# Altium footprint library KwantLib.PcbLib: 249 footprints (part 6 of 16)
Each footprint in its own frame and in the unit in brackets; x right, y up, seen from the top. Pads: shape width x height; smd on the part's side, far side on the other; paste and mask are expansions set on the pad; w line width, h text height; cw(c..) or ccw(c..) is an arc to the next point about the centre after c.
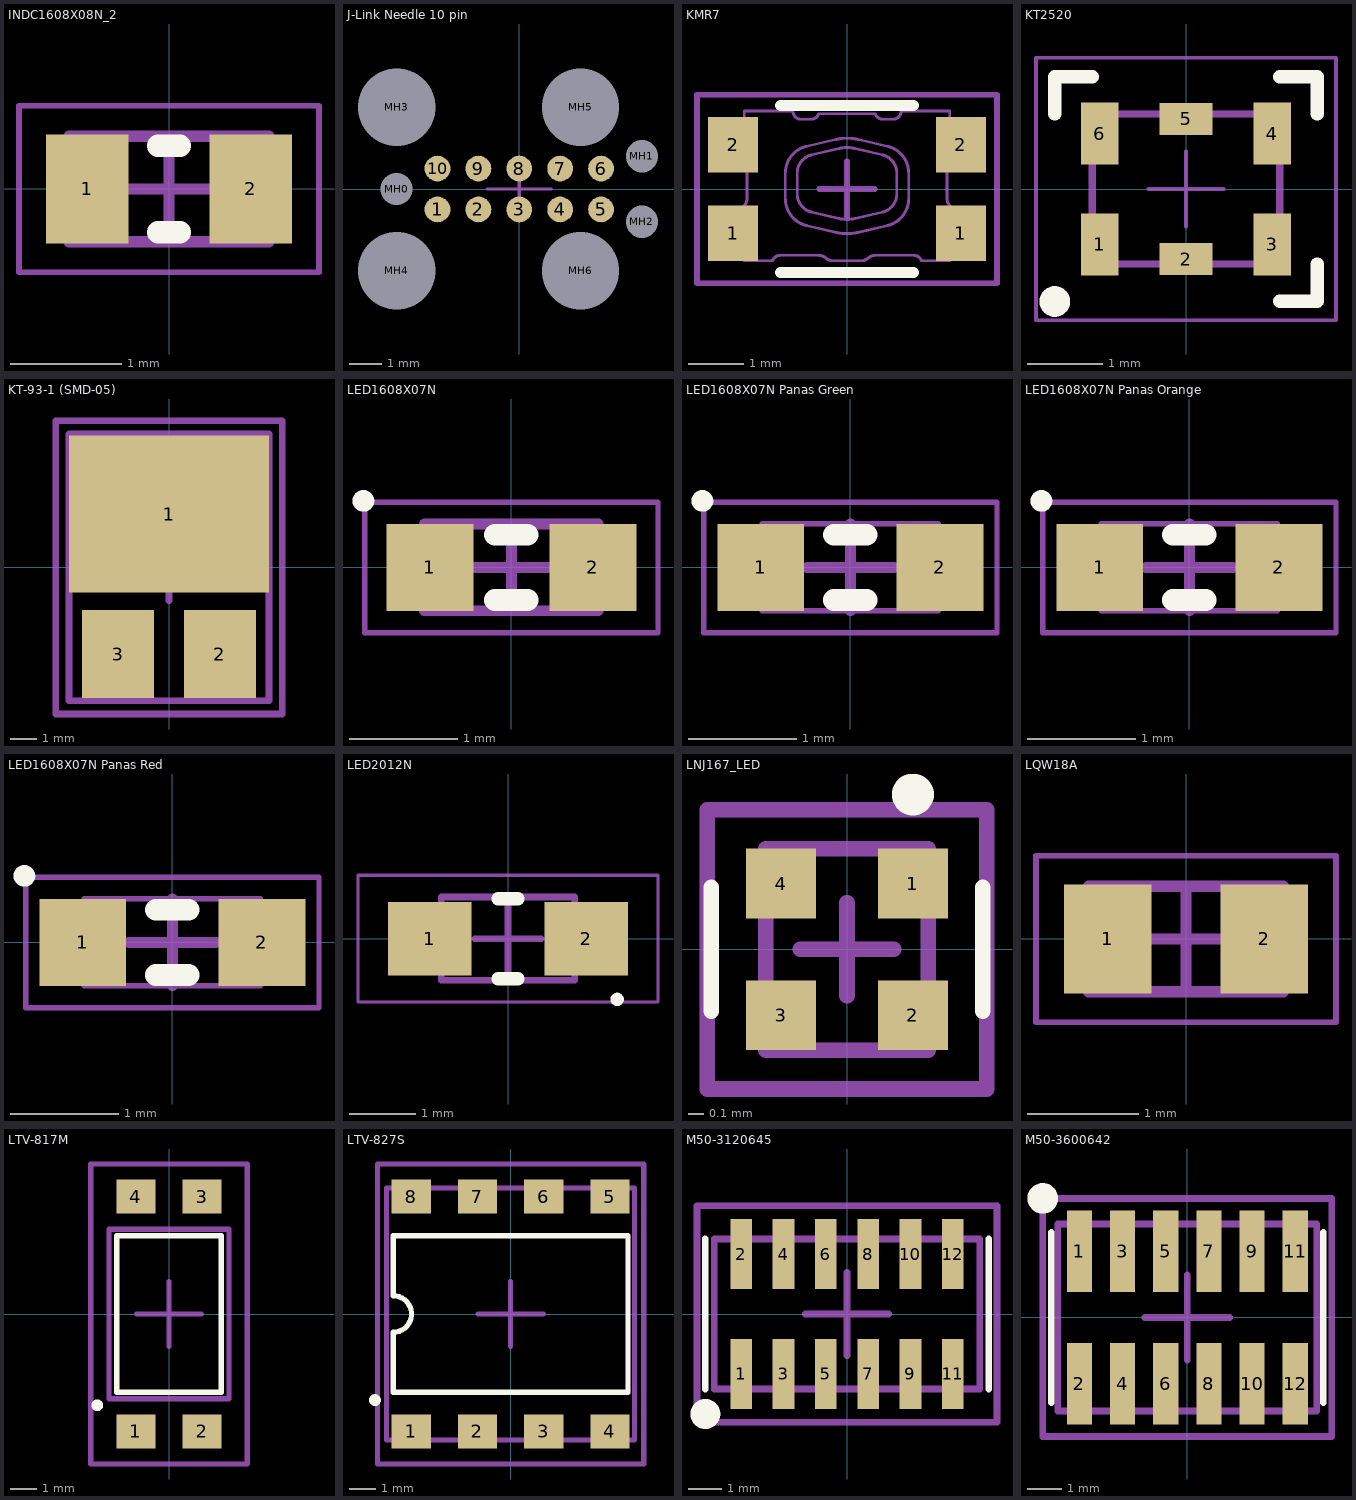
[diagram p5: the footprints below, top view; thin cyan lines are the x and y axes]

## INDC1608X08N_2 [mm] "Chip Inductor, 2-Leads, Body 1.60x0.80mm, IPC Medium Density"
height 0.8
pads (2):
  rect 0.74x0.98 smd: 1(-0.735,0) 2(0.735,0)
Top Overlay:
  lines w0.2: -0.1,-0.39 0.1,-0.39 ; -0.1,0.39 0.1,0.39
Mechanical 13:
  lines w0.1: -0.9,-0.475 0.9,-0.475 0.9,0.475 -0.9,0.475 -0.9,-0.475
Mechanical 15:
  lines w0.05: -1.35,-0.75 1.35,-0.75 1.35,0.75 -1.35,0.75 -1.35,-0.75
  lines w0.1: -0.475,0 0.475,0 ; 0,-0.475 0,0.475
3D body "INDC1608X08N_2.step": height 0.8, standoff 0, extent -0.9,-0.475 0.9,0.475

## J-Link Needle 10 pin [mm]
pads (17):
  round 0.8 smd paste-1 mask+0.07: 1(-2.54,-0.635) 2(-1.27,-0.635) 3(0,-0.635) 4(1.27,-0.635) 5(2.54,-0.635) 6(2.54,0.635) 7(1.27,0.635) 8(0,0.635) 9(-1.27,0.635) 10(-2.54,0.635)
  round 0.8 hole 1 unplated mask+0.07: MH0(-3.81,0) MH1(3.81,1.016) MH2(3.81,-1.016)
  round 0.8 hole 2.4 unplated mask+0.07: MH3(-3.81,2.54) MH4(-3.81,-2.54) MH5(1.905,2.54) MH6(1.905,-2.54)
Mechanical 15:
  lines w0.1: -1,0 1,0 ; 0,-1 0,1

## KMR7 [mm] "Tactile button"
height 2.5
pads (4):
  rect 0.9x1 smd mask+0.07: 1(-2.05,-0.8) 1(2.05,-0.8) 2(-2.05,0.8) 2(2.05,0.8)
Top Overlay:
  lines w0.2: -1.2,-1.5 1.2,-1.5 ; -1.2,1.5 1.2,1.5
Mechanical 3:
  lines w0.1: -2.7,-1.7 -2.7,1.7 2.7,1.7 2.7,-1.7 -2.7,-1.7
Mechanical 13:
  drawing of 3054 lines, arcs and shapes, not listed
Mechanical 15:
  lines w0.1: -0.5,0 0.5,0 ; 0,-0.5 0,0.5
3D body "KMR7.stp": height 2.54, standoff -0.06, extent -2.3,-1.399 2.3,1.451

## KT2520 [mm] "TCXO"
height 0.8
pads (6):
  rect 0.5x0.825 smd paste-0.04 mask+0.07: 1(-1.15,-0.738) 3(1.15,-0.738) 4(1.15,0.738) 6(-1.15,0.738)
  rect 0.7x0.43 smd paste-0.04 mask+0.07: 2(0,-0.935) 5(0,0.935)
Top Overlay:
  circle w0.25: c-1.75,-1.5 r0.08
  lines w0.18: -1.75,1 -1.75,1.5 -1.25,1.5 ; 1.25,-1.5 1.75,-1.5 1.75,-1 ; 1.25,1.5 1.75,1.5 1.75,1
Mechanical 13:
  lines w0.1: -1.25,-1 1.25,-1 1.25,1 -1.25,1 -1.25,-1
Mechanical 15:
  lines w0.05: -0.5,0 0.5,0 ; 0,-0.5 0,0.5 ; -2,-1.75 2,-1.75 2,1.75 -2,1.75 -2,-1.75
3D body "KT2520.stp": height 0.81, standoff 0, extent -1.25,-1 1.25,1

## KT-93-1 (SMD-05) [mm]
height 3
pads (3):
  rect 7.5x5.9 smd: 1(0,2)
  rect 2.7x3.3 smd: 2(1.905,-3.25) 3(-1.905,-3.25)
Mechanical 13:
  lines w0.25: -3.75,-5 3.75,-5 3.75,5 -3.75,5 -3.75,-5
Mechanical 15:
  lines w0.25: -1.25,0 1.25,0 ; 0,-1.25 0,1.25 ; -4.25,-5.5 -4.25,5.5 4.25,5.5 4.25,-5.5 -4.25,-5.5
3D body: height 3, standoff 0.01, extent -3.75,-5 3.75,5

## LED1608X07N [mm] "Chip LED, 2-Leads, Body 1.60x0.80mm, IPC Medium Density"
height 0.65
pads (2):
  rect 0.8x0.8 smd paste-1 mask+0.07: 1(-0.75,0) 2(0.75,0)
Top Overlay:
  circle w0.1: c-1.362,0.612 r0.05
  lines w0.2: -0.15,-0.3 0.15,-0.3 ; -0.15,0.3 0.15,0.3
Top Paste:
  region: 0.5,-0.35 1.1,-0.35 1.1,0.35 0.5,0.35
  region: -1.1,-0.35 -0.5,-0.35 -0.5,0.35 -1.1,0.35
Mechanical 13:
  lines w0.1: -0.8,-0.4 0.8,-0.4 0.8,0.4 -0.8,0.4 -0.8,-0.4
Mechanical 15:
  lines w0.05: -1.35,-0.6 -1.35,0.6 1.35,0.6 1.35,-0.6 -1.35,-0.6
  lines w0.1: -0.4,0 0.4,0 ; 0,-0.4 0,0.4
3D body "LED0603_Norm.stp": height 0.39, standoff 0, extent -0.8,-0.4 0.8,0.4

## LED1608X07N Panas Green [mm] "Chip LED, 2-Leads, Body 1.60x0.80mm, IPC Medium Density"
height 0.25
pads (2):
  rect 0.8x0.8 smd paste-0.05 mask+0.07: 1(-0.825,0) 2(0.825,0)
Top Overlay:
  circle w0.1: c-1.362,0.612 r0.05
  lines w0.2: -0.15,-0.3 0.15,-0.3 ; -0.15,0.3 0.15,0.3
Mechanical 13:
  lines w0.05: -0.81,-0.4 -0.81,0.4 0.81,0.4 0.81,-0.4 -0.81,-0.4
Mechanical 15:
  lines w0.05: -1.35,-0.6 1.35,-0.6 1.35,0.6 -1.35,0.6 -1.35,-0.6
  lines w0.1: -0.4,0 0.4,0 ; 0,-0.4 0,0.4
3D body "LNJ LED Green.stp": height 0.19, standoff -0.01, extent -0.81,-0.4 0.81,0.4

## LED1608X07N Panas Orange [mm] "Chip LED, 2-Leads, Body 1.60x0.80mm, IPC Medium Density"
height 0.25
pads (2):
  rect 0.8x0.8 smd paste-0.05 mask+0.07: 1(-0.825,0) 2(0.825,0)
Top Overlay:
  circle w0.1: c-1.362,0.612 r0.05
  lines w0.2: -0.15,-0.3 0.15,-0.3 ; -0.15,0.3 0.15,0.3
Mechanical 13:
  lines w0.05: -0.81,-0.4 -0.81,0.4 0.81,0.4 0.81,-0.4 -0.81,-0.4
Mechanical 15:
  lines w0.05: -1.35,-0.6 1.35,-0.6 1.35,0.6 -1.35,0.6 -1.35,-0.6
  lines w0.1: -0.4,0 0.4,0 ; 0,-0.4 0,0.4
3D body "LNJ LED Orange.stp": height 0.19, standoff -0.01, extent -0.81,-0.4 0.81,0.4

## LED1608X07N Panas Red [mm] "Chip LED, 2-Leads, Body 1.60x0.80mm, IPC Medium Density"
height 0.25
pads (2):
  rect 0.8x0.8 smd paste-0.05 mask+0.07: 1(-0.825,0) 2(0.825,0)
Top Overlay:
  circle w0.1: c-1.362,0.612 r0.05
  lines w0.2: -0.15,-0.3 0.15,-0.3 ; -0.15,0.3 0.15,0.3
Mechanical 13:
  lines w0.05: -0.81,-0.4 -0.81,0.4 0.81,0.4 0.81,-0.4 -0.81,-0.4
Mechanical 15:
  lines w0.05: -1.35,-0.6 1.35,-0.6 1.35,0.6 -1.35,0.6 -1.35,-0.6
  lines w0.1: -0.4,0 0.4,0 ; 0,-0.4 0,0.4
3D body "LNJ LED Red.stp": height 0.19, standoff -0.01, extent -0.81,-0.4 0.81,0.4

## LED2012N [mm] "Chip Diode, 2-Leads, Body 2.00x1.25mm, IPC Medium Density"
height 0.75
pads (2):
  rect 1.25x1.1 smd: 1(-1.175,0) 2(1.175,0)
Top Overlay:
  circle w0.1: c1.637,-0.912 r0.05
  lines w0.2: -0.15,-0.6 0.15,-0.6 ; -0.15,0.6 0.15,0.6
Mechanical 13:
  lines w0.1: -1,-0.625 -1,0.625 1,0.625 1,-0.625 -1,-0.625
Mechanical 15:
  lines w0.05: -2.25,-0.95 -2.25,0.95 2.25,0.95 2.25,-0.95 -2.25,-0.95
  lines w0.1: -0.5,0 0.5,0 ; 0,-0.5 0,0.5
3D body "APT2012.STEP": height 0.73, standoff -0.02, extent -1,-0.625 1,0.625

## LNJ167_LED [mm]
height 0.25
pads (4):
  rect 0.45x0.45 smd paste-0.02 mask+0.07: 1(0.425,0.425) 2(0.425,-0.425) 3(-0.425,-0.425) 4(-0.425,0.425)
Top Overlay:
  circle w0.2: c0.425,1 r0.035
  lines w0.1: -0.875,-0.4 -0.875,0.4 ; 0.875,-0.4 0.875,0.4
Mechanical 13:
  lines w0.1: -0.525,-0.65 0.525,-0.65 0.525,0.65 -0.525,0.65 -0.525,-0.65
Mechanical 15:
  lines w0.1: -0.3,0 0.3,0 ; 0,-0.3 0,0.3 ; -0.9,-0.9 0.9,-0.9 0.9,0.9 -0.9,0.9 -0.9,-0.9
3D body "LNJ167W.stp": height 0.25, standoff -0.01, extent -0.525,-0.65 0.525,0.65

## LQW18A [mm] "Chip Inductor, 2-Leads, Body 1.60x0.80mm, IPC Medium Density"
height 0.8
pads (2):
  rect 0.79x0.98 smd paste-0.05 mask+0.07: 1(-0.705,0) 2(0.705,0)
Mechanical 13:
  lines w0.1: -0.875,-0.475 0.875,-0.475 0.875,0.475 -0.875,0.475 -0.875,-0.475
Mechanical 15:
  lines w0.05: -1.35,-0.75 1.35,-0.75 1.35,0.75 -1.35,0.75 -1.35,-0.75
  lines w0.1: -0.475,0 0.475,0 ; 0,-0.475 0,0.475
3D body "User Library-INDC1608X80-MURATA_LQW18A.step": height 0.81, standoff 0, extent -0.8,-0.45 0.8,0.45

## LTV-817M [mm]
height 3.5
pads (4):
  rect 1.5x1.3 smd: 1(-1.27,-4.5) 2(1.27,-4.5) 3(1.27,4.5) 4(-1.27,4.5)
Top Overlay:
  circle w0.25: c-2.75,-3.5 r0.1
  lines w0.2: -2,-3 -2,3 2,3 2,-3 -2,-3
Mechanical 13:
  lines w0.2: -2.3,-3.25 -2.3,3.25 2.3,3.25 2.3,-3.25 -2.3,-3.25
Mechanical 15:
  lines w0.2: -1.25,0 1.25,0 ; 0,-1.25 0,1.25 ; -3,-5.75 3,-5.75 3,5.75 -3,5.75 -3,-5.75
3D body "PC817.stp": height 3.85, standoff 0, extent -2.29,-5 2.29,5

## LTV-827S [mm]
height 3.5
pads (8):
  rect 1.5x1.3 smd: 1(-3.81,-4.5) 2(-1.27,-4.5) 3(1.27,-4.5) 4(3.81,-4.5) 5(3.81,4.5) 6(1.27,4.5) 7(-1.27,4.5) 8(-3.81,4.5)
Top Overlay:
  circle w0.25: c-5.2,-3.3 r0.1
  lines w0.2: -4.5,-3 -4.5,-0.7 ccw(c-4.5,0) -4.5,0.7 -4.5,3 4.5,3 4.5,-3 -4.5,-3
Mechanical 13:
  lines w0.2: -4.752,-4.826 -4.752,4.826 4.753,4.826 4.753,-4.826 -4.752,-4.826
Mechanical 15:
  lines w0.2: -1.25,0 1.25,0 ; 0,-1.25 0,1.25 ; -5.1,-5.75 -5.1,5.75 5.1,5.75 5.1,-5.75 -5.1,-5.75
3D body "8-PDIP - LTV-827S.stp": height 3.63, standoff 0, extent -4.752,-4.826 4.753,4.826

## M50-3120645 [mm] "Harwin 1.27mm DIL Vertical SMT Socket"
height 3.4
pads (12):
  rect 0.65x2.1 smd: 1(-3.175,-1.8) 2(-3.175,1.8) 3(-1.905,-1.8) 4(-1.905,1.8) 5(-0.635,-1.8) 6(-0.635,1.8) 7(0.635,-1.8) 8(0.635,1.8) 9(1.905,-1.8) 10(1.905,1.8) 11(3.175,-1.8) 12(3.175,1.8)
Top Overlay:
  circle w0.5: c-4.25,-3 r0.2
  lines w0.2: -4.25,-2.25 -4.25,2.25 ; 4.25,-2.25 4.25,2.25
Mechanical 13:
  lines w0.2: -3.985,-2.25 -3.985,2.25 3.985,2.25 3.985,-2.25 -3.985,-2.25
Mechanical 15:
  lines w0.2: -1.25,0 1.25,0 ; 0,-1.25 0,1.25 ; -4.5,-3.25 -4.5,3.25 4.5,3.25 4.5,-3.25 -4.5,-3.25
3D body "M50-3120645.stp": height 3.6, standoff 0, extent -3.985,-2.25 3.985,2.25

## M50-3600642 [mm] "Harwin 1.27mm DIL Vertical SMT Pin Header"
height 5
pads (12):
  rect 0.74x2.4 smd: 1(-3.175,1.95) 2(-3.175,-1.95) 3(-1.905,1.95) 4(-1.905,-1.95) 5(-0.635,1.95) 6(-0.635,-1.95) 7(0.635,1.95) 8(0.635,-1.95) 9(1.905,1.95) 10(1.905,-1.95) 11(3.175,1.95) 12(3.175,-1.95)
Top Overlay:
  circle w0.5: c-4.25,3.5 r0.2
  lines w0.2: -4,-2.5 -4,2.5 ; 4,-2.5 4,2.5
Mechanical 13:
  lines w0.2: -3.81,-2.75 -3.81,2.75 3.81,2.75 3.81,-2.75 -3.81,-2.75
Mechanical 15:
  lines w0.2: -1.25,0 1.25,0 ; 0,-1.25 0,1.25 ; -4.25,-3.5 -4.25,3.5 4.25,3.5 4.25,-3.5 -4.25,-3.5
3D body "M50-3600642.stp": height 4.68, standoff 0, extent -3.81,-2.75 3.81,2.75